# Altium footprint library WR-PHD_Socket Header.PcbLib: 273 footprints (part 16 of 18) (continued)
## 613064243121 [mm] "Socket Header, Pitch 2.54 mm, THT, Angled, dual row, 64p" (continued)
Top Courtyard:
  lines w0.05: -0.5,0 0.5,0 ; 0,-0.5 0,0.5 ; -41.24,-4.55 41.24,-4.55 41.24,9.1 -41.24,9.1 -41.24,-4.55
3D body "613064243121.stp": height 5.05, standoff -3.25, extent -40.89,-4.25 40.89,8.35

## 613072243121 [mm] "Socket Header, Pitch 2.54 mm, THT, Angled, dual row, 72p"
height 5.08
pads (72):
  rrect50% 1.5x1.5 hole 1.03: 1(-44.45,5.61)
  round 1.5 hole 1.03: 2(-44.45,8.15) 3(-41.91,5.61) 4(-41.91,8.15) 5(-39.37,5.61) 6(-39.37,8.15) 7(-36.83,5.61) 8(-36.83,8.15) 9(-34.29,5.61) 10(-34.29,8.15) 11(-31.75,5.61) 12(-31.75,8.15) 13(-29.21,5.61) 14(-29.21,8.15) 15(-26.67,5.61) 16(-26.67,8.15) 17(-24.13,5.61) 18(-24.13,8.15) 19(-21.59,5.61) 20(-21.59,8.15) 21(-19.05,5.61) 22(-19.05,8.15) 23(-16.51,5.61) 24(-16.51,8.15) 25(-13.97,5.61) 26(-13.97,8.15) 27(-11.43,5.61) 28(-11.43,8.15) 29(-8.89,5.61) 30(-8.89,8.15) 31(-6.35,5.61) 32(-6.35,8.15) 33(-3.81,5.61) 34(-3.81,8.15) 35(-1.27,5.61) 36(-1.27,8.15) 37(1.27,5.61) 38(1.27,8.15) 39(3.81,5.61) 40(3.81,8.15) 41(6.35,5.61) 42(6.35,8.15) 43(8.89,5.61) 44(8.89,8.15) 45(11.43,5.61) 46(11.43,8.15) 47(13.97,5.61) 48(13.97,8.15) 49(16.51,5.61) 50(16.51,8.15) 51(19.05,5.61) 52(19.05,8.15) 53(21.59,5.61) 54(21.59,8.15) 55(24.13,5.61) 56(24.13,8.15) 57(26.67,5.61) 58(26.67,8.15) 59(29.21,5.61) 60(29.21,8.15) 61(31.75,5.61) 62(31.75,8.15) 63(34.29,5.61) 64(34.29,8.15) 65(36.83,5.61) 66(36.83,8.15) 67(39.37,5.61) 68(39.37,8.15) 69(41.91,5.61) 70(41.91,8.15) 71(44.45,5.61) 72(44.45,8.15)
Top Overlay:
  lines w0.2: -46.12,-4.35 -46.12,4.35 46.12,4.35 46.12,-4.35 -46.12,-4.35
  text "2" at -46.28,7.6 h1.02
  text "1" at -46.08,5.1 h1.02
  text "72" at 45.68,7.6 h1.02
  text "71" at 45.68,5.1 h1.02
Top Designator:
  text ".Designator" at -7.498,-0.5 h1.5
Top Component Outline:
  lines w0.1: -44.82,4.25 -44.82,8.35 -44.08,8.35 -44.08,4.25 ; -44.82,5.81 -44.08,5.81 ; -42.28,4.25 -42.28,8.35 -41.54,8.35 -41.54,4.25 ; -42.28,5.81 -41.54,5.81 ; -39.74,4.25 -39.74,8.35 -39,8.35 -39,4.25 ; -39.74,5.81 -39,5.81 ; -37.2,4.25 -37.2,8.35 -36.46,8.35 -36.46,4.25 ; -37.2,5.81 -36.46,5.81 ; -34.66,4.25 -34.66,8.35 -33.92,8.35 -33.92,4.25 ; -34.66,5.81 -33.92,5.81 ; -32.12,4.25 -32.12,8.35 -31.38,8.35 -31.38,4.25 ; -32.12,5.81 -31.38,5.81 ; -29.58,4.25 -29.58,8.35 -28.84,8.35 -28.84,4.25 ; -29.58,5.81 -28.84,5.81 ; -27.04,4.25 -27.04,8.35 -26.3,8.35 -26.3,4.25 ; -27.04,5.81 -26.3,5.81 ; -24.5,4.25 -24.5,8.35 -23.76,8.35 -23.76,4.25 ; -24.5,5.81 -23.76,5.81 ; -21.96,4.25 -21.96,8.35 -21.22,8.35 -21.22,4.25 ; -21.96,5.81 -21.22,5.81 ; -19.42,4.25 -19.42,8.35 -18.68,8.35 -18.68,4.25 ; -19.42,5.81 -18.68,5.81 ; -16.88,4.25 -16.88,8.35 -16.14,8.35 -16.14,4.25 ; -16.88,5.81 -16.14,5.81 ; -14.34,4.25 -14.34,8.35 -13.6,8.35 -13.6,4.25 ; -14.34,5.81 -13.6,5.81 ; -11.8,4.25 -11.8,8.35 -11.06,8.35 -11.06,4.25 ; -11.8,5.81 -11.06,5.81 ; -9.26,4.25 -9.26,8.35 -8.52,8.35 -8.52,4.25 ; -9.26,5.81 -8.52,5.81 ; -6.72,4.25 -6.72,8.35 -5.98,8.35 -5.98,4.25 ; -6.72,5.81 -5.98,5.81 ; -4.18,4.25 -4.18,8.35 -3.44,8.35 -3.44,4.25 ; -4.18,5.81 -3.44,5.81 ; -1.64,4.25 -1.64,8.35 -0.9,8.35 -0.9,4.25 ; -1.64,5.81 -0.9,5.81 ; 0.9,4.25 0.9,8.35 1.64,8.35 1.64,4.25 ; 0.9,5.81 1.64,5.81 ; 3.44,4.25 3.44,8.35 4.18,8.35 4.18,4.25 ; 3.44,5.81 4.18,5.81 ; 5.98,4.25 5.98,8.35 6.72,8.35 6.72,4.25 ; 5.98,5.81 6.72,5.81 ; 8.52,4.25 8.52,8.35 9.26,8.35 9.26,4.25 ; 8.52,5.81 9.26,5.81 ; 11.06,4.25 11.06,8.35 11.8,8.35 11.8,4.25 ; 11.06,5.81 11.8,5.81 ; 13.6,4.25 13.6,8.35 14.34,8.35 14.34,4.25 ; 13.6,5.81 14.34,5.81 ; 16.14,4.25 16.14,8.35 16.88,8.35 16.88,4.25 ; 16.14,5.81 16.88,5.81 ; 18.68,4.25 18.68,8.35 19.42,8.35 19.42,4.25 ; 18.68,5.81 19.42,5.81 ; 21.22,4.25 21.22,8.35 21.96,8.35 21.96,4.25 ; 21.22,5.81 21.96,5.81 ; 23.76,4.25 23.76,8.35 24.5,8.35 24.5,4.25 ; 23.76,5.81 24.5,5.81 ; 26.3,4.25 26.3,8.35 27.04,8.35 27.04,4.25 ; 26.3,5.81 27.04,5.81 ; 28.84,4.25 28.84,8.35 29.58,8.35 29.58,4.25 ; 28.84,5.81 29.58,5.81 ; 31.38,4.25 31.38,8.35 32.12,8.35 32.12,4.25 ; 31.38,5.81 32.12,5.81 ; 33.92,4.25 33.92,8.35 34.66,8.35 34.66,4.25 ; 33.92,5.81 34.66,5.81 ; 36.46,4.25 36.46,8.35 37.2,8.35 37.2,4.25 ; 36.46,5.81 37.2,5.81 ; 39,4.25 39,8.35 39.74,8.35 39.74,4.25 ; 39,5.81 39.74,5.81 ; 41.54,4.25 41.54,8.35 42.28,8.35 42.28,4.25 ; 41.54,5.81 42.28,5.81 ; 44.08,4.25 44.08,8.35 44.82,8.35 44.82,4.25 ; 44.08,5.81 44.82,5.81 ; -45.97,-4.25 -45.97,4.25 45.97,4.25 45.97,-4.25 -45.97,-4.25
Top 3D Body:
  lines w0.1: -44.82,4.25 -44.82,8.35 -44.08,8.35 -44.08,4.25 ; -44.82,5.81 -44.08,5.81 ; -42.28,4.25 -42.28,8.35 -41.54,8.35 -41.54,4.25 ; -42.28,5.81 -41.54,5.81 ; -39.74,4.25 -39.74,8.35 -39,8.35 -39,4.25 ; -39.74,5.81 -39,5.81 ; -37.2,4.25 -37.2,8.35 -36.46,8.35 -36.46,4.25 ; -37.2,5.81 -36.46,5.81 ; -34.66,4.25 -34.66,8.35 -33.92,8.35 -33.92,4.25 ; -34.66,5.81 -33.92,5.81 ; -32.12,4.25 -32.12,8.35 -31.38,8.35 -31.38,4.25 ; -32.12,5.81 -31.38,5.81 ; -29.58,4.25 -29.58,8.35 -28.84,8.35 -28.84,4.25 ; -29.58,5.81 -28.84,5.81 ; -27.04,4.25 -27.04,8.35 -26.3,8.35 -26.3,4.25 ; -27.04,5.81 -26.3,5.81 ; -24.5,4.25 -24.5,8.35 -23.76,8.35 -23.76,4.25 ; -24.5,5.81 -23.76,5.81 ; -21.96,4.25 -21.96,8.35 -21.22,8.35 -21.22,4.25 ; -21.96,5.81 -21.22,5.81 ; -19.42,4.25 -19.42,8.35 -18.68,8.35 -18.68,4.25 ; -19.42,5.81 -18.68,5.81 ; -16.88,4.25 -16.88,8.35 -16.14,8.35 -16.14,4.25 ; -16.88,5.81 -16.14,5.81 ; -14.34,4.25 -14.34,8.35 -13.6,8.35 -13.6,4.25 ; -14.34,5.81 -13.6,5.81 ; -11.8,4.25 -11.8,8.35 -11.06,8.35 -11.06,4.25 ; -11.8,5.81 -11.06,5.81 ; -9.26,4.25 -9.26,8.35 -8.52,8.35 -8.52,4.25 ; -9.26,5.81 -8.52,5.81 ; -6.72,4.25 -6.72,8.35 -5.98,8.35 -5.98,4.25 ; -6.72,5.81 -5.98,5.81 ; -4.18,4.25 -4.18,8.35 -3.44,8.35 -3.44,4.25 ; -4.18,5.81 -3.44,5.81 ; -1.64,4.25 -1.64,8.35 -0.9,8.35 -0.9,4.25 ; -1.64,5.81 -0.9,5.81 ; 0.9,4.25 0.9,8.35 1.64,8.35 1.64,4.25 ; 0.9,5.81 1.64,5.81 ; 3.44,4.25 3.44,8.35 4.18,8.35 4.18,4.25 ; 3.44,5.81 4.18,5.81 ; 5.98,4.25 5.98,8.35 6.72,8.35 6.72,4.25 ; 5.98,5.81 6.72,5.81 ; 8.52,4.25 8.52,8.35 9.26,8.35 9.26,4.25 ; 8.52,5.81 9.26,5.81 ; 11.06,4.25 11.06,8.35 11.8,8.35 11.8,4.25 ; 11.06,5.81 11.8,5.81 ; 13.6,4.25 13.6,8.35 14.34,8.35 14.34,4.25 ; 13.6,5.81 14.34,5.81 ; 16.14,4.25 16.14,8.35 16.88,8.35 16.88,4.25 ; 16.14,5.81 16.88,5.81 ; 18.68,4.25 18.68,8.35 19.42,8.35 19.42,4.25 ; 18.68,5.81 19.42,5.81 ; 21.22,4.25 21.22,8.35 21.96,8.35 21.96,4.25 ; 21.22,5.81 21.96,5.81 ; 23.76,4.25 23.76,8.35 24.5,8.35 24.5,4.25 ; 23.76,5.81 24.5,5.81 ; 26.3,4.25 26.3,8.35 27.04,8.35 27.04,4.25 ; 26.3,5.81 27.04,5.81 ; 28.84,4.25 28.84,8.35 29.58,8.35 29.58,4.25 ; 28.84,5.81 29.58,5.81 ; 31.38,4.25 31.38,8.35 32.12,8.35 32.12,4.25 ; 31.38,5.81 32.12,5.81 ; 33.92,4.25 33.92,8.35 34.66,8.35 34.66,4.25 ; 33.92,5.81 34.66,5.81 ; 36.46,4.25 36.46,8.35 37.2,8.35 37.2,4.25 ; 36.46,5.81 37.2,5.81 ; 39,4.25 39,8.35 39.74,8.35 39.74,4.25 ; 39,5.81 39.74,5.81 ; 41.54,4.25 41.54,8.35 42.28,8.35 42.28,4.25 ; 41.54,5.81 42.28,5.81 ; 44.08,4.25 44.08,8.35 44.82,8.35 44.82,4.25 ; 44.08,5.81 44.82,5.81 ; -45.97,-4.25 -45.97,4.25 45.97,4.25 45.97,-4.25 -45.97,-4.25
Top Courtyard:
  lines w0.05: -0.5,0 0.5,0 ; 0,-0.5 0,0.5 ; -46.32,-4.55 46.32,-4.55 46.32,9.1 -46.32,9.1 -46.32,-4.55
3D body "613072243121.stp": height 5.05, standoff -3.25, extent -45.97,-4.25 45.97,8.35

## 621004242921 [mm] "Socket Header, Pitch 2.00 mm, SMT, Vertical, dual row, 4p"
height 4.85
pads (8):
  rect 0.89x2.1 smd: 1(-1,-2.65) 2(-1,2.65) 3(1,-2.65) 4(1,2.65)
  round 1 hole 1 unplated: M1(-1,-1) M2(-1,1) M3(1,-1) M4(1,1)
Top Overlay:
  lines w0.2: -1.75,-2.075 -2.45,-2.075 -2.45,2.075 -1.75,2.075 ; 1.75,-2.075 2.45,-2.075 2.45,2.075 1.75,2.075
  text "1" at -2.3,-3.5 h1.02
  text "3" at 2,-3.5 h1.02
  text "2" at -2.7,2.4 h1.02
  text "4" at 2,2.4 h1.02
Top Designator:
  text ".Designator" at -7.498,-0.5 h1.5
Top Component Outline:
  lines w0.1: -1.25,-2 -1.25,-3.1 -0.75,-3.1 -0.75,-2 ; -1.25,2 -1.25,3.1 -0.75,3.1 -0.75,2 ; 0.75,-2 0.75,-3.1 1.25,-3.1 1.25,-2 ; 0.75,2 0.75,3.1 1.25,3.1 1.25,2 ; -2.3,-2 2.3,-2 2.3,2 -2.3,2 -2.3,-2
Top 3D Body:
  lines w0.1: -1.25,-2 -1.25,-3.1 -0.75,-3.1 -0.75,-2 ; -1.25,2 -1.25,3.1 -0.75,3.1 -0.75,2 ; 0.75,-2 0.75,-3.1 1.25,-3.1 1.25,-2 ; 0.75,2 0.75,3.1 1.25,3.1 1.25,2 ; -2.3,-2 2.3,-2 2.3,2 -2.3,2 -2.3,-2
Top Courtyard:
  lines w0.05: -0.5,0 0.5,0 ; 0,-0.5 0,0.5 ; -2.65,-3.9 -2.65,3.9 2.65,3.9 2.65,-3.9 -2.65,-3.9
3D body "621004242921.stp": height 4.6, standoff 0, extent -2.25,-3.1 2.25,3.1

## 621006242921 [mm] "Socket Header, Pitch 2.00 mm, SMT, Vertical, dual row, 6p"
height 4.85
pads (12):
  rect 0.89x2.1 smd: 1(-2,-2.65) 2(-2,2.65) 3(0,-2.65) 4(0,2.65) 5(2,-2.65) 6(2,2.65)
  round 1 hole 1 unplated: M1(-2,-1) M2(-2,1) M3(0,-1) M4(0,1) M5(2,-1) M6(2,1)
Top Overlay:
  lines w0.2: -2.75,-2.075 -3.45,-2.075 -3.45,2.075 -2.75,2.075 ; 2.75,-2.075 3.45,-2.075 3.45,2.075 2.75,2.075
  text "5" at 3,-3.5 h1.02
  text "6" at 3,2.4 h1.02
  text "1" at -3.3,-3.5 h1.02
  text "2" at -3.7,2.4 h1.02
Top Designator:
  text ".Designator" at -7.498,-0.5 h1.5
Top Component Outline:
  lines w0.1: -2.25,-2 -2.25,-3.1 -1.75,-3.1 -1.75,-2 ; -2.25,2 -2.25,3.1 -1.75,3.1 -1.75,2 ; -0.25,-2 -0.25,-3.1 0.25,-3.1 0.25,-2 ; -0.25,2 -0.25,3.1 0.25,3.1 0.25,2 ; 1.75,-2 1.75,-3.1 2.25,-3.1 2.25,-2 ; 1.75,2 1.75,3.1 2.25,3.1 2.25,2 ; -3.3,-2 -3.3,2 3.3,2 3.3,-2 -3.3,-2
Top 3D Body:
  lines w0.1: -2.25,-2 -2.25,-3.1 -1.75,-3.1 -1.75,-2 ; -2.25,2 -2.25,3.1 -1.75,3.1 -1.75,2 ; -0.25,-2 -0.25,-3.1 0.25,-3.1 0.25,-2 ; -0.25,2 -0.25,3.1 0.25,3.1 0.25,2 ; 1.75,-2 1.75,-3.1 2.25,-3.1 2.25,-2 ; 1.75,2 1.75,3.1 2.25,3.1 2.25,2 ; -3.3,-2 3.3,-2 3.3,2 -3.3,2 -3.3,-2
Top Courtyard:
  lines w0.05: -0.5,0 0.5,0 ; 0,-0.5 0,0.5 ; -3.65,-3.9 -3.65,3.9 3.65,3.9 3.65,-3.9 -3.65,-3.9
3D body "621006242921.stp": height 4.6, standoff 0, extent -3.25,-3.1 3.25,3.1

## 621008242921 [mm] "Socket Header, Pitch 2.00 mm, SMT, Vertical, dual row, 8p"
height 4.85
pads (16):
  rect 0.89x2.1 smd: 1(-3,-2.65) 2(-3,2.65) 3(-1,-2.65) 4(-1,2.65) 5(1,-2.65) 6(1,2.65) 7(3,-2.65) 8(3,2.65)
  round 1 hole 1 unplated: M1(-3,-1) M2(-3,1) M3(-1,-1) M4(-1,1) M5(1,-1) M6(1,1) M7(3,-1) M8(3,1)
Top Overlay:
  lines w0.2: -3.75,-2.075 -4.45,-2.075 -4.45,2.075 -3.75,2.075 ; 3.75,-2.075 4.45,-2.075 4.45,2.075 3.75,2.075
  text "2" at -4.7,2.4 h1.02
  text "1" at -4.3,-3.5 h1.02
  text "8" at 4,2.4 h1.02
  text "7" at 4,-3.5 h1.02
Top Designator:
  text ".Designator" at -7.498,-0.5 h1.5
Top Component Outline:
  lines w0.1: -3.25,-2 -3.25,-3.1 -2.75,-3.1 -2.75,-2 ; -3.25,2 -3.25,3.1 -2.75,3.1 -2.75,2 ; -1.25,-2 -1.25,-3.1 -0.75,-3.1 -0.75,-2 ; -1.25,2 -1.25,3.1 -0.75,3.1 -0.75,2 ; 0.75,-2 0.75,-3.1 1.25,-3.1 1.25,-2 ; 0.75,2 0.75,3.1 1.25,3.1 1.25,2 ; 2.75,-2 2.75,-3.1 3.25,-3.1 3.25,-2 ; 2.75,2 2.75,3.1 3.25,3.1 3.25,2 ; -4.3,-2 4.3,-2 4.3,2 -4.3,2 -4.3,-2
Top 3D Body:
  lines w0.1: -3.25,-2 -3.25,-3.1 -2.75,-3.1 -2.75,-2 ; -3.25,2 -3.25,3.1 -2.75,3.1 -2.75,2 ; -1.25,-2 -1.25,-3.1 -0.75,-3.1 -0.75,-2 ; -1.25,2 -1.25,3.1 -0.75,3.1 -0.75,2 ; 0.75,-2 0.75,-3.1 1.25,-3.1 1.25,-2 ; 0.75,2 0.75,3.1 1.25,3.1 1.25,2 ; 2.75,-2 2.75,-3.1 3.25,-3.1 3.25,-2 ; 2.75,2 2.75,3.1 3.25,3.1 3.25,2 ; -4.3,-2 -4.3,2 4.3,2 4.3,-2 -4.3,-2
Top Courtyard:
  lines w0.05: -0.5,0 0.5,0 ; 0,-0.5 0,0.5 ; -4.65,-3.9 4.65,-3.9 4.65,3.9 -4.65,3.9 -4.65,-3.9
3D body "621008242921.stp": height 4.6, standoff 0, extent -4.25,-3.1 4.25,3.1

## 621010242921 [mm] "Socket Header, Pitch 2.00 mm, SMT, Vertical, dual row, 10p"
height 4.85
pads (20):
  rect 0.89x2.1 smd: 1(-4,-2.65) 2(-4,2.65) 3(-2,-2.65) 4(-2,2.65) 5(0,-2.65) 6(0,2.65) 7(2,-2.65) 8(2,2.65) 9(4,-2.65) 10(4,2.65)
  round 1 hole 1 unplated: M1(-4,-1) M2(-4,1) M3(-2,-1) M4(-2,1) M5(0,-1) M6(0,1) M7(2,-1) M8(2,1) M9(4,-1) M10(4,1)
Top Overlay:
  lines w0.2: -4.75,-2.075 -5.45,-2.075 -5.45,2.075 -4.75,2.075 ; 4.75,-2.075 5.45,-2.075 5.45,2.075 4.75,2.075
  text "9" at 5,-3.5 h1.02
  text "10" at 5,2.4 h1.02
  text "2" at -5.7,2.4 h1.02
  text "1" at -5.3,-3.5 h1.02
Top Designator:
  text ".Designator" at -7.498,-0.5 h1.5
Top Component Outline:
  lines w0.1: -4.25,-2 -4.25,-3.1 -3.75,-3.1 -3.75,-2 ; -4.25,2 -4.25,3.1 -3.75,3.1 -3.75,2 ; -2.25,-2 -2.25,-3.1 -1.75,-3.1 -1.75,-2 ; -2.25,2 -2.25,3.1 -1.75,3.1 -1.75,2 ; -0.25,-2 -0.25,-3.1 0.25,-3.1 0.25,-2 ; -0.25,2 -0.25,3.1 0.25,3.1 0.25,2 ; 1.75,-2 1.75,-3.1 2.25,-3.1 2.25,-2 ; 1.75,2 1.75,3.1 2.25,3.1 2.25,2 ; 3.75,-2 3.75,-3.1 4.25,-3.1 4.25,-2 ; 3.75,2 3.75,3.1 4.25,3.1 4.25,2 ; -5.3,-2 -5.3,2 5.3,2 5.3,-2 -5.3,-2
Top 3D Body:
  lines w0.1: -4.25,-2 -4.25,-3.1 -3.75,-3.1 -3.75,-2 ; -4.25,2 -4.25,3.1 -3.75,3.1 -3.75,2 ; -2.25,-2 -2.25,-3.1 -1.75,-3.1 -1.75,-2 ; -2.25,2 -2.25,3.1 -1.75,3.1 -1.75,2 ; -0.25,-2 -0.25,-3.1 0.25,-3.1 0.25,-2 ; -0.25,2 -0.25,3.1 0.25,3.1 0.25,2 ; 1.75,-2 1.75,-3.1 2.25,-3.1 2.25,-2 ; 1.75,2 1.75,3.1 2.25,3.1 2.25,2 ; 3.75,-2 3.75,-3.1 4.25,-3.1 4.25,-2 ; 3.75,2 3.75,3.1 4.25,3.1 4.25,2 ; -5.3,-2 -5.3,2 5.3,2 5.3,-2 -5.3,-2
Top Courtyard:
  lines w0.05: -0.5,0 0.5,0 ; 0,-0.5 0,0.5 ; -5.65,-3.9 5.65,-3.9 5.65,3.9 -5.65,3.9 -5.65,-3.9
3D body "621010242921.stp": height 4.6, standoff 0, extent -5.25,-3.1 5.25,3.1

## 621014242921 [mm] "Socket Header, Pitch 2.00 mm, SMT, Vertical, dual row, 14p"
height 4.85
pads (28):
  rect 0.89x2.1 smd: 1(-6,-2.65) 2(-6,2.65) 3(-4,-2.65) 4(-4,2.65) 5(-2,-2.65) 6(-2,2.65) 7(0,-2.65) 8(0,2.65) 9(2,-2.65) 10(2,2.65) 11(4,-2.65) 12(4,2.65) 13(6,-2.65) 14(6,2.65)
  round 1 hole 1 unplated: M1(-6,-1) M2(-6,1) M3(-4,-1) M4(-4,1) M5(-2,-1) M6(-2,1) M7(0,-1) M8(0,1) M9(2,-1) M10(2,1) M11(4,-1) M12(4,1) M13(6,-1) M14(6,1)
Top Overlay:
  lines w0.2: -6.75,-2.075 -7.45,-2.075 -7.45,2.075 -6.75,2.075 ; 6.75,-2.075 7.45,-2.075 7.45,2.075 6.75,2.075
  text "2" at -7.7,2.4 h1.02
  text "1" at -7.3,-3.5 h1.02
  text "14" at 7,2.4 h1.02
  text "13" at 7,-3.5 h1.02
Top Designator:
  text ".Designator" at -7.498,-0.5 h1.5
Top Component Outline:
  lines w0.1: -6.25,-2 -6.25,-3.1 -5.75,-3.1 -5.75,-2 ; -6.25,2 -6.25,3.1 -5.75,3.1 -5.75,2 ; -4.25,-2 -4.25,-3.1 -3.75,-3.1 -3.75,-2 ; -4.25,2 -4.25,3.1 -3.75,3.1 -3.75,2 ; -2.25,-2 -2.25,-3.1 -1.75,-3.1 -1.75,-2 ; -2.25,2 -2.25,3.1 -1.75,3.1 -1.75,2 ; -0.25,-2 -0.25,-3.1 0.25,-3.1 0.25,-2 ; -0.25,2 -0.25,3.1 0.25,3.1 0.25,2 ; 1.75,-2 1.75,-3.1 2.25,-3.1 2.25,-2 ; 1.75,2 1.75,3.1 2.25,3.1 2.25,2 ; 3.75,-2 3.75,-3.1 4.25,-3.1 4.25,-2 ; 3.75,2 3.75,3.1 4.25,3.1 4.25,2 ; 5.75,-2 5.75,-3.1 6.25,-3.1 6.25,-2 ; 5.75,2 5.75,3.1 6.25,3.1 6.25,2 ; -7.3,-2 -7.3,2 7.3,2 7.3,-2 -7.3,-2
Top 3D Body:
  lines w0.1: -6.25,-2 -6.25,-3.1 -5.75,-3.1 -5.75,-2 ; -6.25,2 -6.25,3.1 -5.75,3.1 -5.75,2 ; -4.25,-2 -4.25,-3.1 -3.75,-3.1 -3.75,-2 ; -4.25,2 -4.25,3.1 -3.75,3.1 -3.75,2 ; -2.25,-2 -2.25,-3.1 -1.75,-3.1 -1.75,-2 ; -2.25,2 -2.25,3.1 -1.75,3.1 -1.75,2 ; -0.25,-2 -0.25,-3.1 0.25,-3.1 0.25,-2 ; -0.25,2 -0.25,3.1 0.25,3.1 0.25,2 ; 1.75,-2 1.75,-3.1 2.25,-3.1 2.25,-2 ; 1.75,2 1.75,3.1 2.25,3.1 2.25,2 ; 3.75,-2 3.75,-3.1 4.25,-3.1 4.25,-2 ; 3.75,2 3.75,3.1 4.25,3.1 4.25,2 ; 5.75,-2 5.75,-3.1 6.25,-3.1 6.25,-2 ; 5.75,2 5.75,3.1 6.25,3.1 6.25,2 ; -7.3,-2 -7.3,2 7.3,2 7.3,-2 -7.3,-2
Top Courtyard:
  lines w0.05: -0.5,0 0.5,0 ; 0,-0.5 0,0.5 ; -7.65,-3.9 7.65,-3.9 7.65,3.9 -7.65,3.9 -7.65,-3.9
3D body "621014242921.stp": height 4.6, standoff 0, extent -7.25,-3.1 7.25,3.1

## 621016242921 [mm] "Socket Header, Pitch 2.00 mm, SMT, Vertical, dual row, 16p"
height 4.85
pads (32):
  rect 0.89x2.1 smd: 1(-7,-2.65) 2(-7,2.65) 3(-5,-2.65) 4(-5,2.65) 5(-3,-2.65) 6(-3,2.65) 7(-1,-2.65) 8(-1,2.65) 9(1,-2.65) 10(1,2.65) 11(3,-2.65) 12(3,2.65) 13(5,-2.65) 14(5,2.65) 15(7,-2.65) 16(7,2.65)
  round 1 hole 1 unplated: M1(-7,-1) M2(-7,1) M3(-5,-1) M4(-5,1) M5(-3,-1) M6(-3,1) M7(-1,-1) M8(-1,1) M9(1,-1) M10(1,1) M11(3,-1) M12(3,1) M13(5,-1) M14(5,1) M15(7,-1) M16(7,1)
Top Overlay:
  lines w0.2: -7.75,-2.075 -8.45,-2.075 -8.45,2.075 -7.75,2.075 ; 7.75,-2.075 8.45,-2.075 8.45,2.075 7.75,2.075
  text "15" at 8,-3.5 h1.02
  text "16" at 8,2.4 h1.02
  text "1" at -8.3,-3.5 h1.02
  text "2" at -8.7,2.4 h1.02
Top Designator:
  text ".Designator" at -7.498,-0.5 h1.5
Top Component Outline:
  lines w0.1: -7.25,-2 -7.25,-3.1 -6.75,-3.1 -6.75,-2 ; -7.25,2 -7.25,3.1 -6.75,3.1 -6.75,2 ; -5.25,-2 -5.25,-3.1 -4.75,-3.1 -4.75,-2 ; -5.25,2 -5.25,3.1 -4.75,3.1 -4.75,2 ; -3.25,-2 -3.25,-3.1 -2.75,-3.1 -2.75,-2 ; -3.25,2 -3.25,3.1 -2.75,3.1 -2.75,2 ; -1.25,-2 -1.25,-3.1 -0.75,-3.1 -0.75,-2 ; -1.25,2 -1.25,3.1 -0.75,3.1 -0.75,2 ; 0.75,-2 0.75,-3.1 1.25,-3.1 1.25,-2 ; 0.75,2 0.75,3.1 1.25,3.1 1.25,2 ; 2.75,-2 2.75,-3.1 3.25,-3.1 3.25,-2 ; 2.75,2 2.75,3.1 3.25,3.1 3.25,2 ; 4.75,-2 4.75,-3.1 5.25,-3.1 5.25,-2 ; 4.75,2 4.75,3.1 5.25,3.1 5.25,2 ; 6.75,-2 6.75,-3.1 7.25,-3.1 7.25,-2 ; 6.75,2 6.75,3.1 7.25,3.1 7.25,2 ; -8.3,-2 -8.3,2 8.3,2 8.3,-2 -8.3,-2
Top 3D Body:
  lines w0.1: -7.25,-2 -7.25,-3.1 -6.75,-3.1 -6.75,-2 ; -7.25,2 -7.25,3.1 -6.75,3.1 -6.75,2 ; -5.25,-2 -5.25,-3.1 -4.75,-3.1 -4.75,-2 ; -5.25,2 -5.25,3.1 -4.75,3.1 -4.75,2 ; -3.25,-2 -3.25,-3.1 -2.75,-3.1 -2.75,-2 ; -3.25,2 -3.25,3.1 -2.75,3.1 -2.75,2 ; -1.25,-2 -1.25,-3.1 -0.75,-3.1 -0.75,-2 ; -1.25,2 -1.25,3.1 -0.75,3.1 -0.75,2 ; 0.75,-2 0.75,-3.1 1.25,-3.1 1.25,-2 ; 0.75,2 0.75,3.1 1.25,3.1 1.25,2 ; 2.75,-2 2.75,-3.1 3.25,-3.1 3.25,-2 ; 2.75,2 2.75,3.1 3.25,3.1 3.25,2 ; 4.75,-2 4.75,-3.1 5.25,-3.1 5.25,-2 ; 4.75,2 4.75,3.1 5.25,3.1 5.25,2 ; 6.75,-2 6.75,-3.1 7.25,-3.1 7.25,-2 ; 6.75,2 6.75,3.1 7.25,3.1 7.25,2 ; -8.3,-2 8.3,-2 8.3,2 -8.3,2 -8.3,-2
Top Courtyard:
  lines w0.05: -0.5,0 0.5,0 ; 0,-0.5 0,0.5 ; -8.65,-3.9 -8.65,3.9 8.65,3.9 8.65,-3.9 -8.65,-3.9
3D body "621016242921.stp": height 4.6, standoff 0, extent -8.25,-3.1 8.25,3.1

## 621020242921 [mm] "Socket Header, Pitch 2.00 mm, SMT, Vertical, dual row, 20p"
height 4.85
pads (40):
  rect 0.89x2.1 smd: 1(-9,-2.65) 2(-9,2.65) 3(-7,-2.65) 4(-7,2.65) 5(-5,-2.65) 6(-5,2.65) 7(-3,-2.65) 8(-3,2.65) 9(-1,-2.65) 10(-1,2.65) 11(1,-2.65) 12(1,2.65) 13(3,-2.65) 14(3,2.65) 15(5,-2.65) 16(5,2.65) 17(7,-2.65) 18(7,2.65) 19(9,-2.65) 20(9,2.65)
  round 1 hole 1 unplated: M1(-9,-1) M2(-9,1) M3(-7,-1) M4(-7,1) M5(-5,-1) M6(-5,1) M7(-3,-1) M8(-3,1) M9(-1,-1) M10(-1,1) M11(1,-1) M12(1,1) M13(3,-1) M14(3,1) M15(5,-1) M16(5,1) M17(7,-1) M18(7,1) M19(9,-1) M20(9,1)
Top Overlay:
  lines w0.2: -9.75,-2.075 -10.45,-2.075 -10.45,2.075 -9.75,2.075 ; 9.75,-2.075 10.45,-2.075 10.45,2.075 9.75,2.075
  text "19" at 10,-3.5 h1.02
  text "20" at 10,2.4 h1.02
  text "2" at -10.7,2.4 h1.02
  text "1" at -10.3,-3.5 h1.02
Top Designator:
  text ".Designator" at -7.498,-0.5 h1.5
Top Component Outline:
  lines w0.1: -9.25,-2 -9.25,-3.1 -8.75,-3.1 -8.75,-2 ; -9.25,2 -9.25,3.1 -8.75,3.1 -8.75,2 ; -7.25,-2 -7.25,-3.1 -6.75,-3.1 -6.75,-2 ; -7.25,2 -7.25,3.1 -6.75,3.1 -6.75,2 ; -5.25,-2 -5.25,-3.1 -4.75,-3.1 -4.75,-2 ; -5.25,2 -5.25,3.1 -4.75,3.1 -4.75,2 ; -3.25,-2 -3.25,-3.1 -2.75,-3.1 -2.75,-2 ; -3.25,2 -3.25,3.1 -2.75,3.1 -2.75,2 ; -1.25,-2 -1.25,-3.1 -0.75,-3.1 -0.75,-2 ; -1.25,2 -1.25,3.1 -0.75,3.1 -0.75,2 ; 0.75,-2 0.75,-3.1 1.25,-3.1 1.25,-2 ; 0.75,2 0.75,3.1 1.25,3.1 1.25,2 ; 2.75,-2 2.75,-3.1 3.25,-3.1 3.25,-2 ; 2.75,2 2.75,3.1 3.25,3.1 3.25,2 ; 4.75,-2 4.75,-3.1 5.25,-3.1 5.25,-2 ; 4.75,2 4.75,3.1 5.25,3.1 5.25,2 ; 6.75,-2 6.75,-3.1 7.25,-3.1 7.25,-2 ; 6.75,2 6.75,3.1 7.25,3.1 7.25,2 ; 8.75,-2 8.75,-3.1 9.25,-3.1 9.25,-2 ; 8.75,2 8.75,3.1 9.25,3.1 9.25,2 ; -10.3,-2 -10.3,2 10.3,2 10.3,-2 -10.3,-2
Top 3D Body:
  lines w0.1: -9.25,-2 -9.25,-3.1 -8.75,-3.1 -8.75,-2 ; -9.25,2 -9.25,3.1 -8.75,3.1 -8.75,2 ; -7.25,-2 -7.25,-3.1 -6.75,-3.1 -6.75,-2 ; -7.25,2 -7.25,3.1 -6.75,3.1 -6.75,2 ; -5.25,-2 -5.25,-3.1 -4.75,-3.1 -4.75,-2 ; -5.25,2 -5.25,3.1 -4.75,3.1 -4.75,2 ; -3.25,-2 -3.25,-3.1 -2.75,-3.1 -2.75,-2 ; -3.25,2 -3.25,3.1 -2.75,3.1 -2.75,2 ; -1.25,-2 -1.25,-3.1 -0.75,-3.1 -0.75,-2 ; -1.25,2 -1.25,3.1 -0.75,3.1 -0.75,2 ; 0.75,-2 0.75,-3.1 1.25,-3.1 1.25,-2 ; 0.75,2 0.75,3.1 1.25,3.1 1.25,2 ; 2.75,-2 2.75,-3.1 3.25,-3.1 3.25,-2 ; 2.75,2 2.75,3.1 3.25,3.1 3.25,2 ; 4.75,-2 4.75,-3.1 5.25,-3.1 5.25,-2 ; 4.75,2 4.75,3.1 5.25,3.1 5.25,2 ; 6.75,-2 6.75,-3.1 7.25,-3.1 7.25,-2 ; 6.75,2 6.75,3.1 7.25,3.1 7.25,2 ; 8.75,-2 8.75,-3.1 9.25,-3.1 9.25,-2 ; 8.75,2 8.75,3.1 9.25,3.1 9.25,2 ; -10.3,-2 -10.3,2 10.3,2 10.3,-2 -10.3,-2
Top Courtyard:
  lines w0.05: -0.5,0 0.5,0 ; 0,-0.5 0,0.5 ; -10.65,-3.9 10.65,-3.9 10.65,3.9 -10.65,3.9 -10.65,-3.9
3D body "621020242921.stp": height 4.6, standoff 0, extent -10.25,-3.1 10.25,3.1

## 621024242921 [mm] "Socket Header, Pitch 2.00 mm, SMT, Vertical, dual row, 24p"
height 4.85
pads (48):
  rect 0.89x2.1 smd: 1(-11,-2.65) 2(-11,2.65) 3(-9,-2.65) 4(-9,2.65) 5(-7,-2.65) 6(-7,2.65) 7(-5,-2.65) 8(-5,2.65) 9(-3,-2.65) 10(-3,2.65) 11(-1,-2.65) 12(-1,2.65) 13(1,-2.65) 14(1,2.65) 15(3,-2.65) 16(3,2.65) 17(5,-2.65) 18(5,2.65) 19(7,-2.65) 20(7,2.65) 21(9,-2.65) 22(9,2.65) 23(11,-2.65) 24(11,2.65)
  round 1 hole 1 unplated: M1(-11,-1) M2(-11,1) M3(-9,-1) M4(-9,1) M5(-7,-1) M6(-7,1) M7(-5,-1) M8(-5,1) M9(-3,-1) M10(-3,1) M11(-1,-1) M12(-1,1) M13(1,-1) M14(1,1) M15(3,-1) M16(3,1) M17(5,-1) M18(5,1) M19(7,-1) M20(7,1) M21(9,-1) M22(9,1) M23(11,-1) M24(11,1)
Top Overlay:
  lines w0.2: -11.75,-2.075 -12.45,-2.075 -12.45,2.075 -11.75,2.075 ; 11.75,-2.075 12.45,-2.075 12.45,2.075 11.75,2.075
  text "23" at 12,-3.5 h1.02
  text "24" at 12,2.4 h1.02
  text "2" at -12.7,2.4 h1.02
  text "1" at -12.3,-3.5 h1.02
Top Designator:
  text ".Designator" at -7.498,-0.5 h1.5
Top Component Outline:
  lines w0.1: -11.25,-2 -11.25,-3.1 -10.75,-3.1 -10.75,-2 ; -11.25,2 -11.25,3.1 -10.75,3.1 -10.75,2 ; -9.25,-2 -9.25,-3.1 -8.75,-3.1 -8.75,-2 ; -9.25,2 -9.25,3.1 -8.75,3.1 -8.75,2 ; -7.25,-2 -7.25,-3.1 -6.75,-3.1 -6.75,-2 ; -7.25,2 -7.25,3.1 -6.75,3.1 -6.75,2 ; -5.25,-2 -5.25,-3.1 -4.75,-3.1 -4.75,-2 ; -5.25,2 -5.25,3.1 -4.75,3.1 -4.75,2 ; -3.25,-2 -3.25,-3.1 -2.75,-3.1 -2.75,-2 ; -3.25,2 -3.25,3.1 -2.75,3.1 -2.75,2 ; -1.25,-2 -1.25,-3.1 -0.75,-3.1 -0.75,-2 ; -1.25,2 -1.25,3.1 -0.75,3.1 -0.75,2 ; 0.75,-2 0.75,-3.1 1.25,-3.1 1.25,-2 ; 0.75,2 0.75,3.1 1.25,3.1 1.25,2 ; 2.75,-2 2.75,-3.1 3.25,-3.1 3.25,-2 ; 2.75,2 2.75,3.1 3.25,3.1 3.25,2 ; 4.75,-2 4.75,-3.1 5.25,-3.1 5.25,-2 ; 4.75,2 4.75,3.1 5.25,3.1 5.25,2 ; 6.75,-2 6.75,-3.1 7.25,-3.1 7.25,-2 ; 6.75,2 6.75,3.1 7.25,3.1 7.25,2 ; 8.75,-2 8.75,-3.1 9.25,-3.1 9.25,-2 ; 8.75,2 8.75,3.1 9.25,3.1 9.25,2 ; 10.75,-2 10.75,-3.1 11.25,-3.1 11.25,-2 ; 10.75,2 10.75,3.1 11.25,3.1 11.25,2 ; -12.3,-2 -12.3,2 12.3,2 12.3,-2 -12.3,-2
Top 3D Body:
  lines w0.1: -11.25,-2 -11.25,-3.1 -10.75,-3.1 -10.75,-2 ; -11.25,2 -11.25,3.1 -10.75,3.1 -10.75,2 ; -9.25,-2 -9.25,-3.1 -8.75,-3.1 -8.75,-2 ; -9.25,2 -9.25,3.1 -8.75,3.1 -8.75,2 ; -7.25,-2 -7.25,-3.1 -6.75,-3.1 -6.75,-2 ; -7.25,2 -7.25,3.1 -6.75,3.1 -6.75,2 ; -5.25,-2 -5.25,-3.1 -4.75,-3.1 -4.75,-2 ; -5.25,2 -5.25,3.1 -4.75,3.1 -4.75,2 ; -3.25,-2 -3.25,-3.1 -2.75,-3.1 -2.75,-2 ; -3.25,2 -3.25,3.1 -2.75,3.1 -2.75,2 ; -1.25,-2 -1.25,-3.1 -0.75,-3.1 -0.75,-2 ; -1.25,2 -1.25,3.1 -0.75,3.1 -0.75,2 ; 0.75,-2 0.75,-3.1 1.25,-3.1 1.25,-2 ; 0.75,2 0.75,3.1 1.25,3.1 1.25,2 ; 2.75,-2 2.75,-3.1 3.25,-3.1 3.25,-2 ; 2.75,2 2.75,3.1 3.25,3.1 3.25,2 ; 4.75,-2 4.75,-3.1 5.25,-3.1 5.25,-2 ; 4.75,2 4.75,3.1 5.25,3.1 5.25,2 ; 6.75,-2 6.75,-3.1 7.25,-3.1 7.25,-2 ; 6.75,2 6.75,3.1 7.25,3.1 7.25,2 ; 8.75,-2 8.75,-3.1 9.25,-3.1 9.25,-2 ; 8.75,2 8.75,3.1 9.25,3.1 9.25,2 ; 10.75,-2 10.75,-3.1 11.25,-3.1 11.25,-2 ; 10.75,2 10.75,3.1 11.25,3.1 11.25,2 ; -12.3,-2 -12.3,2 12.3,2 12.3,-2 -12.3,-2
Top Courtyard:
  lines w0.05: -0.5,0 0.5,0 ; 0,-0.5 0,0.5 ; -12.65,-3.9 12.65,-3.9 12.65,3.9 -12.65,3.9 -12.65,-3.9
3D body "621024242921.stp": height 4.6, standoff 0, extent -12.25,-3.1 12.25,3.1